# Altium footprint library Sajad_Altium_Library.PcbLib: 380 footprints (part 22 of 24)
Each footprint in its own frame and in the unit in brackets; x right, y up, seen from the top. Pads: shape width x height; smd on the part's side, far side on the other; paste and mask are expansions set on the pad; w line width, h text height; cw(c..) or ccw(c..) is an arc to the next point about the centre after c.
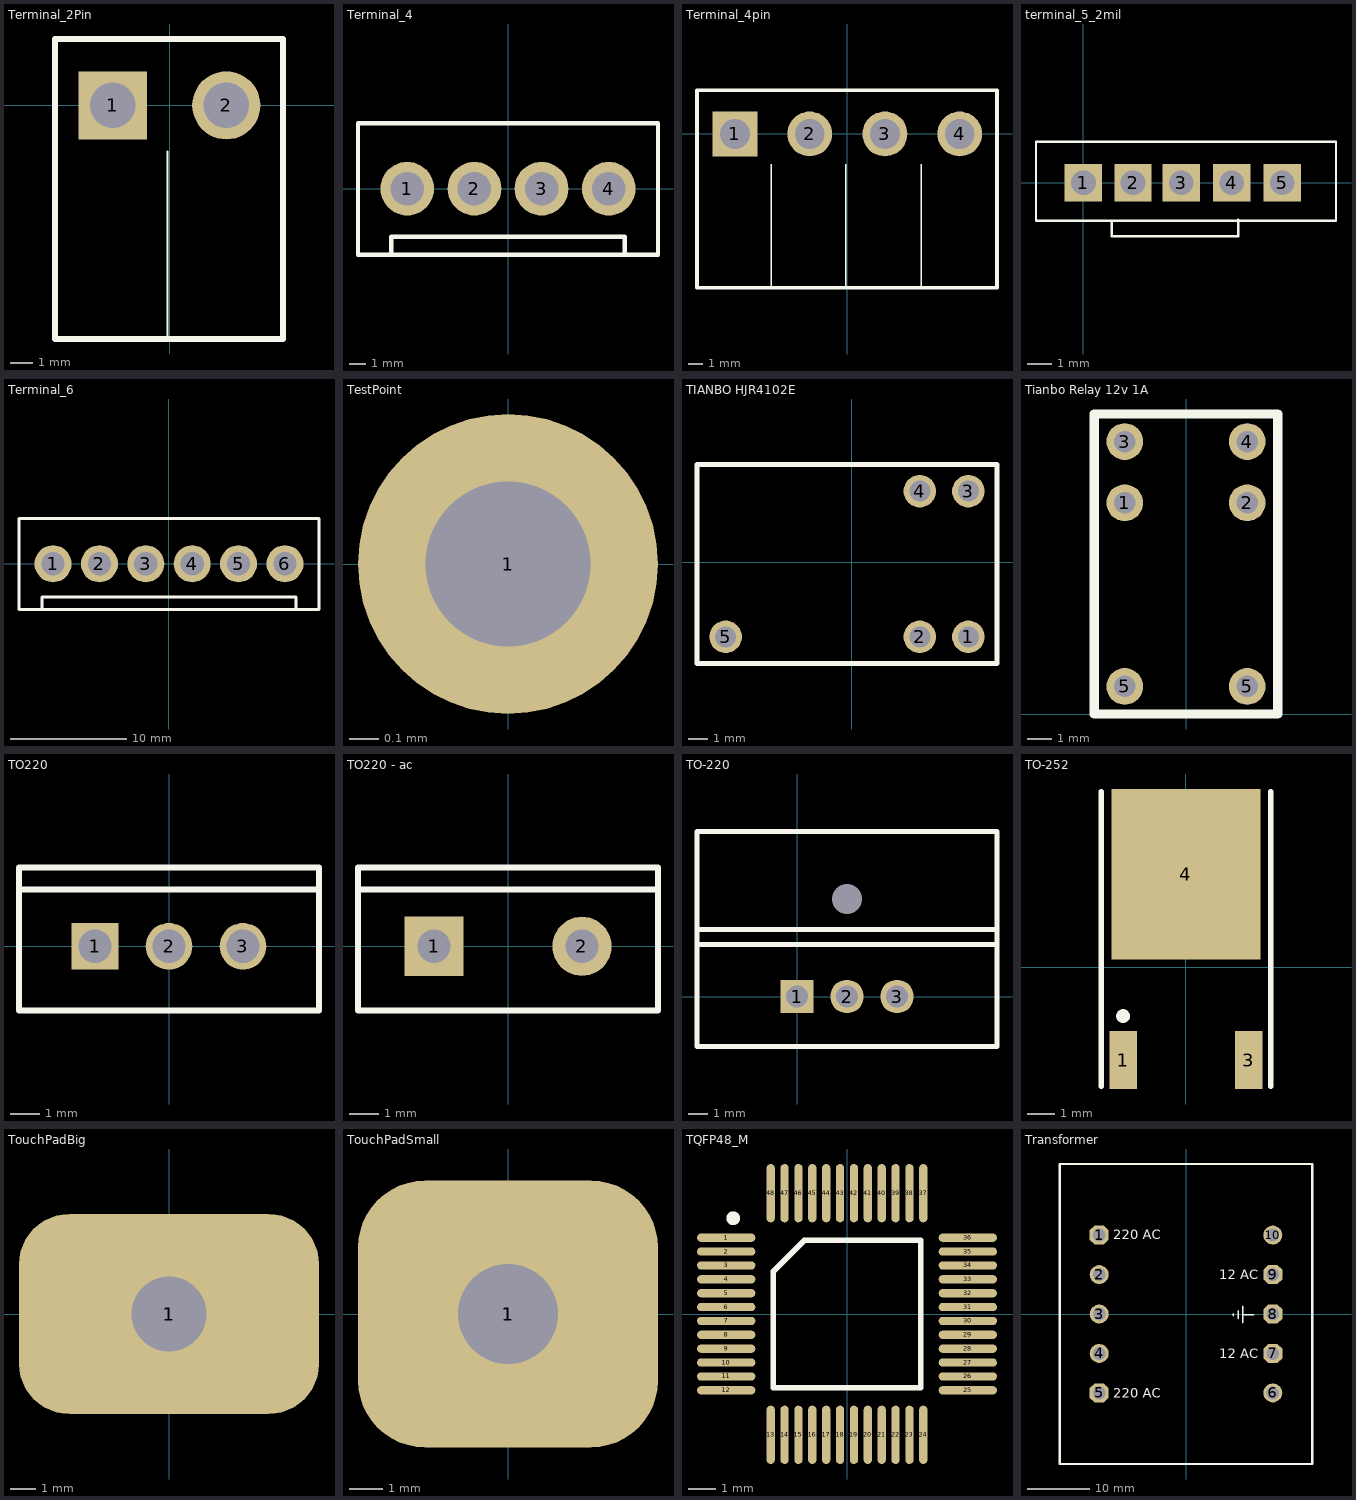
[diagram p21: the footprints below, top view; thin cyan lines are the x and y axes]

## Terminal_2Pin [mm]
height 0.55
pads (2):
  rect 3x3 hole 2: 1(-2.5,0)
  round 3 hole 2: 2(2.5,0)
Top Overlay:
  lines w0.1: -0.087,-10.287 -0.087,-2.032
  lines w0.25: -5.04,-10.287 4.993,-10.287 4.993,2.921 -5.04,2.921 -5.04,-10.287
3D body: height 8.47, standoff -4, extent -4.949,-10.07 5.051,1.93

## Terminal_4 [mm] "Terminal 4 pin"
pads (4):
  round 3.2 hole 2: 1(-6,0) 2(-2,0) 3(2,0) 4(6,0)
Top Overlay:
  lines w0.254: -8.934,-3.931 -8.934,3.893 ; -8.934,-3.931 -8.934,3.893 ; -8.934,-3.931 8.934,-3.931 ; -8.934,3.893 8.934,3.893 ; -6.953,-2.864 -6.953,-3.931 -6.953,-2.864 ; -6.953,-2.864 6.953,-2.864 ; 6.953,-2.864 6.953,-3.931 6.953,-2.864 ; 8.934,-3.931 8.934,3.893 ; 8.934,-3.931 8.934,3.893

## Terminal_4pin [mm]
height 0.55
pads (4):
  rect 3x3 hole 2: 1(-7.517,0)
  round 3 hole 2: 2(-2.516,0) 3(2.516,0) 4(7.517,0)
Top Overlay:
  lines w0.1: -5.104,-10.287 -5.104,-2.032 ; -0.103,-10.287 -0.103,-2.032 ; 4.929,-10.287 4.929,-2.032
  lines w0.25: -10.057,-10.287 10.009,-10.287 10.009,2.921 -10.057,2.921 -10.057,-10.287
3D body: height 8.6, standoff -3.5, extent -10,-9.993 10,2.007

## terminal_5_2mil [mm]
height 0.55
pads (5):
  rect 1.5x1.5 hole 1: 1(0,0) 2(2,0) 3(3.937,0) 4(5.969,0) 5(8.001,0)
Top Overlay:
  lines w0.1: 1.143,-1.524 1.143,-2.159 6.223,-2.159 6.223,-1.488 ; -1.905,-1.524 10.16,-1.524 10.16,1.651 -1.905,1.651 -1.905,-1.524

## Terminal_6 [mm] "Terminal 6 pin"
pads (6):
  round 3.2 hole 2: 1(-10,0) 2(-6,0) 3(-2,0) 4(2,0) 5(6,0) 6(10,0)
Top Overlay:
  lines w0.254: 10.953,-3.931 10.953,-2.864 -10.953,-2.864 ; -12.934,-3.931 12.934,-3.931 12.934,3.893 -12.934,3.893 ; -12.934,-3.931 -12.934,3.893 ; -12.934,-3.931 -12.934,3.893 ; -10.953,-2.864 -10.953,-3.931 -10.953,-2.864

## TestPoint [mil] "TestPoint"
pads (1):
  round 40 hole 22: 1(0,0)

## TIANBO HJR4102E [mm] "TIANBO HJR4102E 12 v 3 A relay"
pads (5):
  round 1.7 hole 1.1: 1(6.099,-3.912) 2(3.559,-3.912) 3(6.099,3.708) 4(3.559,3.708) 5(-6.601,-3.912)
Top Overlay:
  lines w0.254: -8.101,-5.302 7.599,-5.302 7.599,5.098 -8.101,5.098 -8.101,-5.302

## Tianbo Relay 12v 1A [mil] "Tianbo Relay 12v 1A"
pads (6):
  round 60 hole 35: 1(-100,345) 2(100,345) 3(-100,445) 4(100,445) 5(-100,45) 5(100,45)
Top Overlay:
  lines w15: -150,0 -150,490 150,490 150,0 -150,0

## TO220 [mm] "TO220"
pads (3):
  rect 1.6x1.6 hole 1.143: 1(-2.54,0)
  round 1.6 hole 1.143: 2(0,0) 3(2.54,0)
Top Overlay:
  lines w0.2: -5.15,1.946 5.15,1.946 ; -5.15,-2.2 -5.15,2.7 5.15,2.7 5.15,-2.2 -5.15,-2.2
3D body: height 20.8, standoff -7.98, extent -4.95,-2.159 4.95,2.341

## TO220 - ac [mil] "TO220"
pads (2):
  rect 80x80 hole 45: 1(-100,0)
  round 80 hole 45: 2(100,0)
Top Overlay:
  lines w7.87: -202.76,76.61 202.76,76.61 ; -202.76,-86.61 -202.76,106.3 202.76,106.3 202.76,-86.61 -202.76,-86.61
3D body: height 818.9, standoff -314.17, extent -194.88,-85 194.88,92.17

## TO-220 [mm] "With Heatsink"
pads (4):
  rect 1.7x1.7 hole 1.1: 1(0,0)
  round 1.7 hole 1.1: 2(2.54,0) 3(5.08,0)
  round 0 hole 1.524: 4(2.54,4.953)
Top Overlay:
  lines w0.254: -5.08,2.642 10.16,2.642 ; -5.08,3.404 10.16,3.404 ; -5.08,-2.54 -5.08,4.953 -5.08,8.382 10.16,8.382 10.16,-2.54 7.366,-2.54 -2.413,-2.54 -5.08,-2.54
3D body: height 20.8, standoff -7.98, extent -2.41,-2.159 7.49,2.341
3D body: height 25, standoff -3.8, extent -4.851,-2.48 9.931,8.322

## TO-252 [mm]
pads (3):
  rect 1x2.1 smd: 1(-2.285,-3.375) 3(2.285,-3.375)
  rect 5.4x6.2 smd: 4(0,3.375)
Top Overlay:
  circle w0.25: c-2.285,-1.775 r0.125
  lines w0.2: -3.085,-4.325 -3.085,6.375 ; 3.085,-4.325 3.085,6.375
3D body: height 2.34, standoff -0.07, extent -3.27,-3.906 3.27,6.033

## TouchPadBig [mm]
pads (2):
  rrect50% 12x8 smd: 1(0,0)
  round 1.524 hole 3: 1(0,0)

## TouchPadSmall [mm]
pads (2):
  rrect50% 9x8 smd: 1(0,0)
  round 1.524 hole 3: 1(0,0)

## TQFP48_M [mm] "48-Pin Thin Quad Flat Pack 0.5 mm Pitch, IPC Low Density"
height 1.6
pads (48):
  oval 2.1x0.3 smd: 1(-4.354,2.75) 2(-4.354,2.25) 3(-4.354,1.75) 4(-4.354,1.25) 5(-4.354,0.75) 6(-4.354,0.25) 7(-4.354,-0.25) 8(-4.354,-0.75) 9(-4.354,-1.25) 10(-4.354,-1.75) 11(-4.354,-2.25) 12(-4.354,-2.75) 25(4.354,-2.75) 26(4.354,-2.25) 27(4.354,-1.75) 28(4.354,-1.25) 29(4.354,-0.75) 30(4.354,-0.25) 31(4.354,0.25) 32(4.354,0.75) 33(4.354,1.25) 34(4.354,1.75) 35(4.354,2.25) 36(4.354,2.75)
  oval 0.3x2.1 smd: 13(-2.75,-4.354) 14(-2.25,-4.354) 15(-1.75,-4.354) 16(-1.25,-4.354) 17(-0.75,-4.354) 18(-0.25,-4.354) 19(0.25,-4.354) 20(0.75,-4.354) 21(1.25,-4.354) 22(1.75,-4.354) 23(2.25,-4.354) 24(2.75,-4.354) 37(2.75,4.354) 38(2.25,4.354) 39(1.75,4.354) 40(1.25,4.354) 41(0.75,4.354) 42(0.25,4.354) 43(-0.25,4.354) 44(-0.75,4.354) 45(-1.25,4.354) 46(-1.75,4.354) 47(-2.25,4.354) 48(-2.75,4.354)
Top Overlay:
  circle w0.25: c-4.1,3.45 r0.125
  lines w0.2: -2.65,-2.65 2.65,-2.65 2.65,2.65 -1.541,2.65 -2.65,1.541 -2.65,-2.65
3D body: height 1.56, standoff -0.01, extent -4.386,-4.386 4.386,4.386

## Transformer [mil] "On Board Transformer"
pads (10):
  oct 120x120 hole 80: 1(-550,500) 5(-550,-500) 7(550,-250) 8(550,0) 9(550,250)
  round 120 hole 80: 2(-550,250) 3(-550,0) 4(-550,-250) 6(550,-500) 10(550,500)
Top Overlay:
  lines w10: 300,-10 300,0 ; 330,-30 330,20 ; 360,-55 360,-5 ; 360,50 360,-5 ; 430,-5 360,-5
  lines w15: -800,-950 -800,950 800,950 800,-950 -800,-950
  text "12 AC" at 210,-280 h60
  text "12 AC" at 210,220 h60
  text "220 AC" at -460,475 h60
  text "220 AC" at -460,-530 h60